# Altium footprint library LHAC-4XDSP2XV7-VP5_0226_3.PcbLib: 96 footprints (part 7 of 12)
Each footprint in its own frame and in the unit in brackets; x right, y up, seen from the top. Pads: shape width x height; smd on the part's side, far side on the other; paste and mask are expansions set on the pad; w line width, h text height; cw(c..) or ccw(c..) is an arc to the next point about the centre after c.
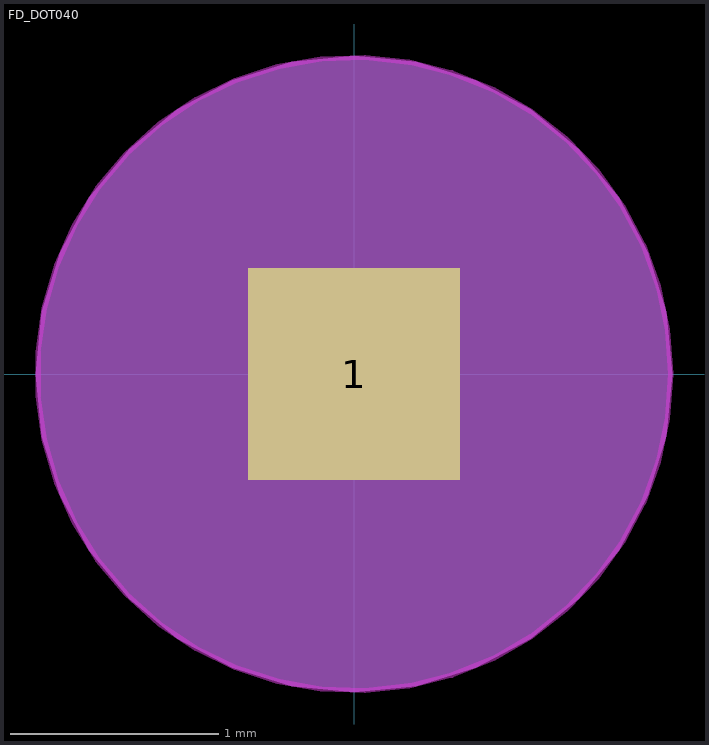
[diagram p6: the footprint, top view; thin cyan lines are the x and y axes]

## FD_DOT040 [mil] "FD_DOT040"
pads (1):
  rect 40.2x40.2 smd: 1(0,0)
Top Layer keep-out:
  circle w1: c0,0 r60
Mechanical 14:
  text "1" at -10,0 h25
Mechanical 16:
  pour cut-out: 60.29,0 59.13,11.76 55.7,23.07 50.13,33.5 42.63,42.63 33.5,50.13 23.07,55.7 11.76,59.13 0,60.29 -11.76,59.13 -23.07,55.7 -33.5,50.13 -42.63,42.63 -50.13,33.5 -55.7,23.07 -59.13,11.76 -60.29,0 -59.13,-11.76 -55.7,-23.07 -50.13,-33.5 -42.63,-42.63 -33.5,-50.13 -23.07,-55.7 -11.76,-59.13 0,-60.29 11.76,-59.13 23.07,-55.7 33.5,-50.13 42.63,-42.63 50.13,-33.5 55.7,-23.07 59.13,-11.76
3D body: height 150, standoff 0, extent -60.29,-60.29 60.29,60.29